# Altium footprint library GyokuRe.PcbLib: 1248 footprints (part 71 of 78)
Each footprint in its own frame and in the unit in brackets; x right, y up, seen from the top. Pads: shape width x height; smd on the part's side, far side on the other; paste and mask are expansions set on the pad; w line width, h text height; cw(c..) or ccw(c..) is an arc to the next point about the centre after c.
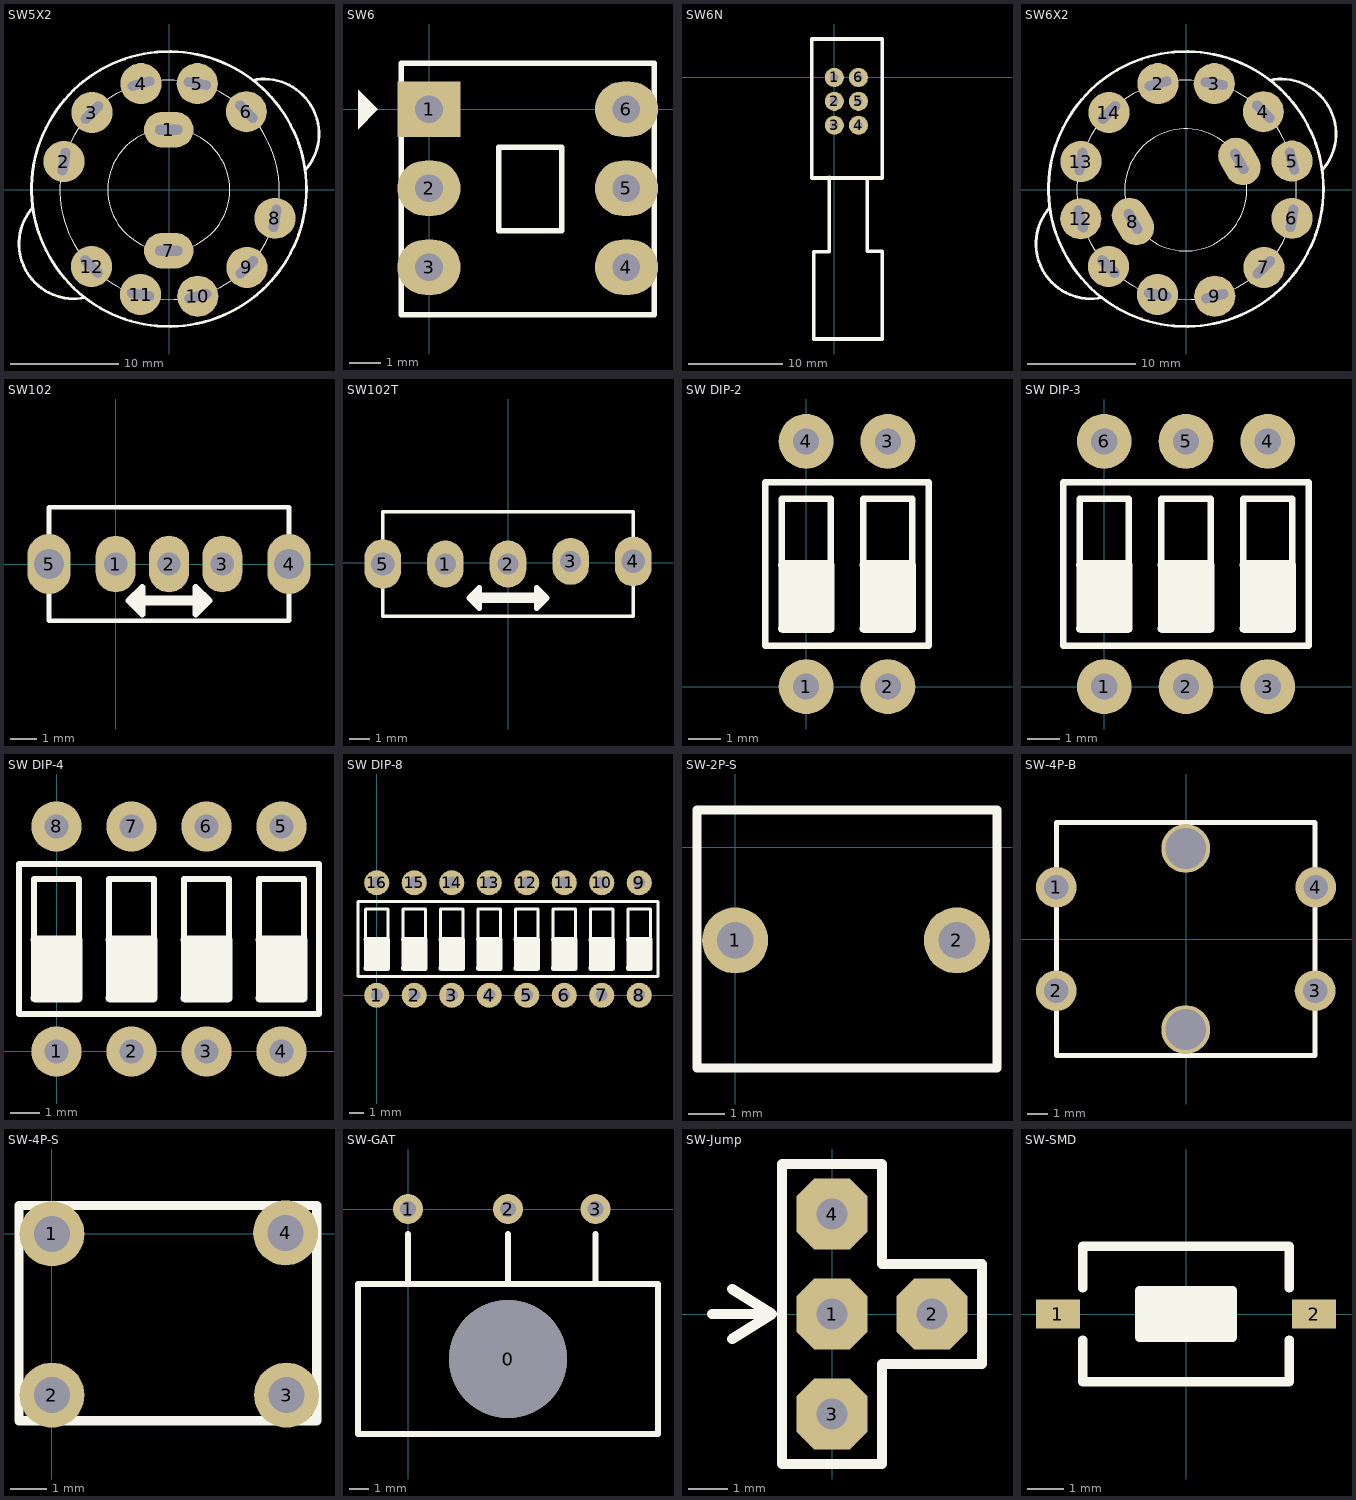
[diagram p70: the footprints below, top view; thin cyan lines are the x and y axes]

## SW5X2 [mil] "Switch 5x2"
height 500
pads (12):
  oval 180x130 hole 35 slot 100 at 0 deg: 1(-2.46,219.46) 7(-2.46,-221.54)
  round 150 hole 35 slot 100 at 80 deg: 2(-384.48,103.48) 8(384.48,-103.48)
  round 150 hole 35 slot 100 at 45 deg: 3(-282.26,282.26) 9(282.26,-282.26)
  round 150 hole 35 slot 100 at 15 deg: 4(-103.48,387.48) 10(103.48,-387.48)
  round 150 hole 35 slot 100 at 170 deg: 5(101.54,387.46) 11(-105.2,-381.27)
  round 150 hole 35 slot 100 at 135 deg: 6(280.32,285.24) 12(-283.98,-279.05)
Top Overlay:
  circle w1: c-2.46,0.46 r222.5
  circle w1: c0.54,0.46 r400
  circle w10: c-1.46,3.46 r501
  lines w10: -498,-63.94 ccw(c-348.29,-196.56) -307.65,-392.38 ; 303.52,399.93 cw(c345.18,204.32) 495.11,71.95

## SW6 [mil] "SW DTDP - 6Pin 260x300x300 mil"
pads (6):
  rect 80x70 hole 35: 1(0,0)
  oval 80x70 hole 35: 2(0,-100) 3(0,-200) 4(250,-200) 5(250,-100) 6(250,0)
Top Overlay:
  region: -90,25 -65,0 -90,-25
  lines w7: -35,-260 -35,58 285,58 285,-260 -35,-260 ; 88,-154 88,-48 168,-48 168,-154 88,-154
3D body "User Library-PSM1-0-0.STEP": height 532.1, standoff -137.19, extent -33.48,-259.48 281.48,55.49

## SW6N [mil]
pads (6):
  round 80 hole 35: 1(0,0) 2(0,-100) 3(0,-200) 4(101,-200) 5(101,-100) 6(101,0)
Top Overlay:
  lines w15: -21,-419 -21,-730 -87,-730 -87,-1095 201,-1095 201,-728 137,-728 137,-421 142,-421 ; -95,-421 -95,161 200,161 200,-421 -95,-421
3D body "User Library-DPDT Push Switch-1.STEP": height 394.31, standoff -156.88, extent -95,-1096.66 200.28,161.56

## SW6X2 [mil] "Switch 6x2"
height 500
pads (14):
  oval 180x130 hole 35 slot 100 at 120 deg rot 120: 1(193,104) 8(-195,-115)
  round 150 hole 35 slot 100 at 15 deg: 2(-103.48,387.48) 9(103.48,-387.48)
  round 150 hole 35 slot 100 at 170 deg: 3(101.54,387.46) 10(-105.2,-381.27)
  round 150 hole 35 slot 100 at 135 deg: 4(280.32,285.24) 11(-283.98,-279.05)
  round 150 hole 35 slot 100 at 105 deg: 5(385,105) 12(-385,-105)
  round 150 hole 35 slot 100 at 80 deg: 6(384.48,-103.48) 13(-384.48,103.48)
  round 150 hole 35 slot 100 at 45 deg: 7(282.26,-282.26) 14(-282.26,282.26)
Top Overlay:
  circle w10: c-1.46,3.46 r501
  circle w1: c0.54,0.46 r400
  circle w1: c-2.46,0.46 r222.5
  lines w10: -498,-63.94 ccw(c-348.29,-196.56) -307.65,-392.38 ; 303.52,399.93 cw(c345.18,204.32) 495.11,71.95

## SW102 [mil] "Switch 102 On Board nho"
height 2
pads (5):
  oval 60x85 hole 35: 1(0,0) 2(80,0) 3(160,0)
  oval 65x90 hole 45: 4(260,0) 5(-100,0)
Top Overlay:
  lines w7: -100,-45 -100,-85 260,-85 260,-45 ; -100,45 -100,85 260,85 260,45
  lines w10: 20,-55 40,-35 40,-75 20,-55 ; 120,-75 120,-35 140,-55 120,-75
  lines w15: 30,-55 130,-55

## SW102T [mil] "Switch 102 On Board To"
height 2
pads (5):
  oval 70x90 hole 40: 1(-120,-2.5) 2(0,-2.5) 3(120,2.5)
  oval 70x95 hole 45: 4(240,2.5) 5(-240,-2.5)
Top Overlay:
  lines w7: -240,-50 -240,-102.5 240,-102.5 240,-45 ; -240,45 -240,97.5 240,97.5 240,45
  lines w10: -75,-67.5 -55,-47.5 -55,-87.5 -75,-67.5 ; 55,-87.5 55,-47.5 75,-67.5 55,-87.5
  lines w20: -65,-67.5 65,-67.5

## SW DIP-2 [mil] "Switch; 4 Leads; Solder Pad 35mil"
pads (4):
  round 67 hole 32: 1(0,0) 2(100,0) 3(100,300) 4(0,300)
Top Overlay:
  region: 133.06,153.06 134.33,150 134.33,70 133.06,66.94 130,65.67 70,65.67 66.94,66.94 65.67,70 70,110 65.67,150 66.94,153.06 70,154.33 130,154.33
  region: 33.06,153.06 34.33,150 34.33,70 33.06,66.94 30,65.67 -30,65.67 -33.06,66.94 -34.33,70 -30,110 -34.33,150 -33.06,153.06 -30,154.33 30,154.33
  lines w8: -50,50 150,50 150,250 -50,250 -50,200 -50,50 ; -30,70 -30,230 30,230 30,70 -30,70 ; 70,70 70,230 130,230 130,70 70,70
3D body "User Library-DIP-Switch-2.step": height 145.67, standoff -275.59, extent -69.37,-44.88 170,344.88

## SW DIP-3 [mil] "Switch; 6 Leads; Solder Pad 35mil"
pads (6):
  round 67 hole 32: 1(0,0) 2(100,0) 3(200,0) 4(200,300) 5(100,300) 6(0,300)
Top Overlay:
  region: 233.06,153.06 234.33,150 234.33,70 233.06,66.94 230,65.67 170,65.67 166.94,66.94 165.67,70 170,110 165.67,150 166.94,153.06 170,154.33 230,154.33
  region: 33.06,153.06 34.33,150 34.33,70 33.06,66.94 30,65.67 -30,65.67 -33.06,66.94 -34.33,70 -30,110 -34.33,150 -33.06,153.06 -30,154.33 30,154.33
  region: 133.06,153.06 134.33,150 134.33,70 133.06,66.94 130,65.67 70,65.67 66.94,66.94 65.67,70 70,110 65.67,150 66.94,153.06 70,154.33 130,154.33
  lines w8: -50,50 -50,200 -50,250 250,250 250,50 -50,50 ; -30,70 30,70 30,230 -30,230 -30,70 ; 70,70 130,70 130,230 70,230 70,70 ; 170,70 170,230 230,230 230,70 170,70
3D body "User Library-DIP-Switch-3.STEP": height 275.59, standoff -145.67, extent -69.68,-44.88 269.7,344.89

## SW DIP-4 [mil] "Switch; 8 Leads; Solder Pad 35mil"
pads (8):
  round 67 hole 32: 1(0,0) 2(100,0) 3(200,0) 4(300,0) 5(300,300) 6(200,300) 7(100,300) 8(0,300)
Top Overlay:
  region: 133.06,153.06 134.33,150 134.33,70 133.06,66.94 130,65.67 70,65.67 66.94,66.94 65.67,70 70,110 65.67,150 66.94,153.06 70,154.33 130,154.33
  region: 33.06,153.06 34.33,150 34.33,70 33.06,66.94 30,65.67 -30,65.67 -33.06,66.94 -34.33,70 -30,110 -34.33,150 -33.06,153.06 -30,154.33 30,154.33
  region: 233.06,153.06 234.33,150 234.33,70 233.06,66.94 230,65.67 170,65.67 166.94,66.94 165.67,70 170,110 165.67,150 166.94,153.06 170,154.33 230,154.33
  region: 333.06,153.06 334.33,150 334.33,70 333.06,66.94 330,65.67 270,65.67 266.94,66.94 265.67,70 270,110 265.67,150 266.94,153.06 270,154.33 330,154.33
  lines w8: -50,50 350,50 350,250 -50,250 -50,200 -50,50 ; -30,70 -30,230 30,230 30,70 -30,70 ; 70,70 70,230 130,230 130,70 70,70 ; 170,70 230,70 230,230 170,230 170,70 ; 270,70 330,70 330,230 270,230 270,70
3D body "User Library-DIP-Switch-4.STEP": height 275.59, standoff -145.67, extent -69.69,-45 369.69,344.77

## SW DIP-8 [mil] "Switch; 16 Leads; Solder Pad 35mil"
pads (16):
  round 67 hole 32: 1(0,0) 2(100,0) 3(200,0) 4(300,0) 5(400,0) 6(500,0) 7(600,0) 8(700,0) 9(700,300) 10(600,300) 11(500,300) 12(400,300) 13(300,300) 14(200,300) 15(100,300) 16(0,300)
Top Overlay:
  region: 133.06,153.06 134.33,150 134.33,70 133.06,66.94 130,65.67 70,65.67 66.94,66.94 65.67,70 70,110 65.67,150 66.94,153.06 70,154.33 130,154.33
  region: 33.06,153.06 34.33,150 34.33,70 33.06,66.94 30,65.67 -30,65.67 -33.06,66.94 -34.33,70 -30,110 -34.33,150 -33.06,153.06 -30,154.33 30,154.33
  region: 233.06,153.06 234.33,150 234.33,70 233.06,66.94 230,65.67 170,65.67 166.94,66.94 165.67,70 170,110 165.67,150 166.94,153.06 170,154.33 230,154.33
  region: 333.06,153.06 334.33,150 334.33,70 333.06,66.94 330,65.67 270,65.67 266.94,66.94 265.67,70 270,110 265.67,150 266.94,153.06 270,154.33 330,154.33
  region: 433.06,153.06 434.33,150 434.33,70 433.06,66.94 430,65.67 370,65.67 366.94,66.94 365.67,70 370,110 365.67,150 366.94,153.06 370,154.33 430,154.33
  region: 533.06,153.06 534.33,150 534.33,70 533.06,66.94 530,65.67 470,65.67 466.94,66.94 465.67,70 470,110 465.67,150 466.94,153.06 470,154.33 530,154.33
  region: 633.06,153.06 634.33,150 634.33,70 633.06,66.94 630,65.67 570,65.67 566.94,66.94 565.67,70 570,110 565.67,150 566.94,153.06 570,154.33 630,154.33
  region: 733.06,153.06 734.33,150 734.33,70 733.06,66.94 730,65.67 670,65.67 666.94,66.94 665.67,70 670,110 665.67,150 666.94,153.06 670,154.33 730,154.33
  lines w8: -50,50 750,50 750,250 -50,250 -50,200 -50,50 ; -30,70 -30,230 30,230 30,70 -30,70 ; 70,70 70,230 130,230 130,70 70,70 ; 170,70 230,70 230,230 170,230 170,70 ; 270,70 330,70 330,230 270,230 270,70 ; 370,70 370,230 430,230 430,70 370,70 ; 470,70 470,230 530,230 530,70 470,70 ; 570,70 570,230 630,230 630,70 570,70 ; 670,70 670,230 730,230 730,70 670,70
3D body "User Library-DIP-Switch-8.STEP": height 275.59, standoff -145.67, extent -69.68,-44.88 769.69,344.89

## SW-2P-S [mm]
height 5.59
pads (2):
  round 1.8 hole 1: 1(0,-2.54) 2(6.045,-2.54)
Top Overlay:
  lines w0.254: -1.041,-6.02 -1.041,1.016 7.137,1.016 7.137,-6.02 -1.041,-6.02

## SW-4P-B [mm] "Nut bam lon"
pads (6):
  round 2 hole 1.2: 1(-6.375,2.54) 2(-6.375,-2.54) 3(6.325,-2.54) 4(6.35,2.54)
  round 2.4 hole 2: ""(-0.025,-4.445) ""(-0.025,4.445)
Top Overlay:
  lines w0.254: -6.375,-5.715 6.325,-5.715 6.325,5.715 -6.375,5.715 -6.375,-5.715
3D body "User Library-Button-BIG-4.step": height 9.5, standoff -3.5, extent -6.936,-6 6.937,6

## SW-4P-S [mm]
height 5.59
pads (4):
  round 1.8 hole 1: 1(0,0) 2(0,-4.47) 3(6.502,-4.47) 4(6.477,0.025)
Top Overlay:
  lines w0.254: -0.914,-5.182 7.341,-5.182 7.341,0.787 6.934,0.787 -0.914,0.787 -0.914,-5.182
3D body "User Library-Button-small-4pin.step": height 9.52, standoff -3.48, extent -0.864,-5.235 7.348,0.765

## SW-GAT [mm]
pads (4):
  round 6 hole 6: 0(5.08,-7.62)
  round 1.524 hole 0.8: 1(0,0) 2(5.08,0) 3(9.525,0)
Top Overlay:
  lines w0.305: 0,-3.81 0,-1.27 ; 5.08,-3.81 5.08,-1.27 ; 9.525,-3.81 9.525,-1.27 ; -2.54,-11.43 12.7,-11.43 12.7,-3.81 -2.54,-3.81 -2.54,-11.43

## SW-Jump [mm]
pads (4):
  oct 1.8x1.8 hole 0.8: 1(0,0) 2(2.54,0) 3(0,-2.54) 4(0,2.54)
Top Overlay:
  lines w0.254: -3.048,0 -1.524,0 ; -2.54,-0.635 -1.524,0 ; -2.54,0.635 -1.524,0 ; -1.27,-3.81 1.27,-3.81 1.27,-1.27 3.81,-1.27 3.81,1.27 1.27,1.27 1.27,3.81 -1.27,3.81 -1.27,-1.27 -1.27,1.27 -1.27,-3.81

## SW-SMD [mm] "Switch SMD type"
pads (2):
  rect 1.2x0.8 smd: 1(-3.5,0) 2(3.5,0)
Top Overlay:
  rectangle: -1.27,-0.635 1.27,0.635
  lines w0.254: -2.819,-0.711 -2.819,-1.854 2.819,-1.854 2.819,-0.711 ; -2.819,0.711 -2.819,1.854 2.819,1.854 2.819,0.711 ; -1.27,-0.635 1.27,-0.635 1.27,0.635 -1.27,0.635 -1.27,-0.635
3D body "User Library-Button-SMD.step": height 2.5, standoff 0, extent -3.05,-1.85 3.05,1.85